# Altium footprint library Lib.PcbLib: 52 footprints (part 3 of 4)
Each footprint in its own frame and in the unit in brackets; x right, y up, seen from the top. Pads: shape width x height; smd on the part's side, far side on the other; paste and mask are expansions set on the pad; w line width, h text height; cw(c..) or ccw(c..) is an arc to the next point about the centre after c.
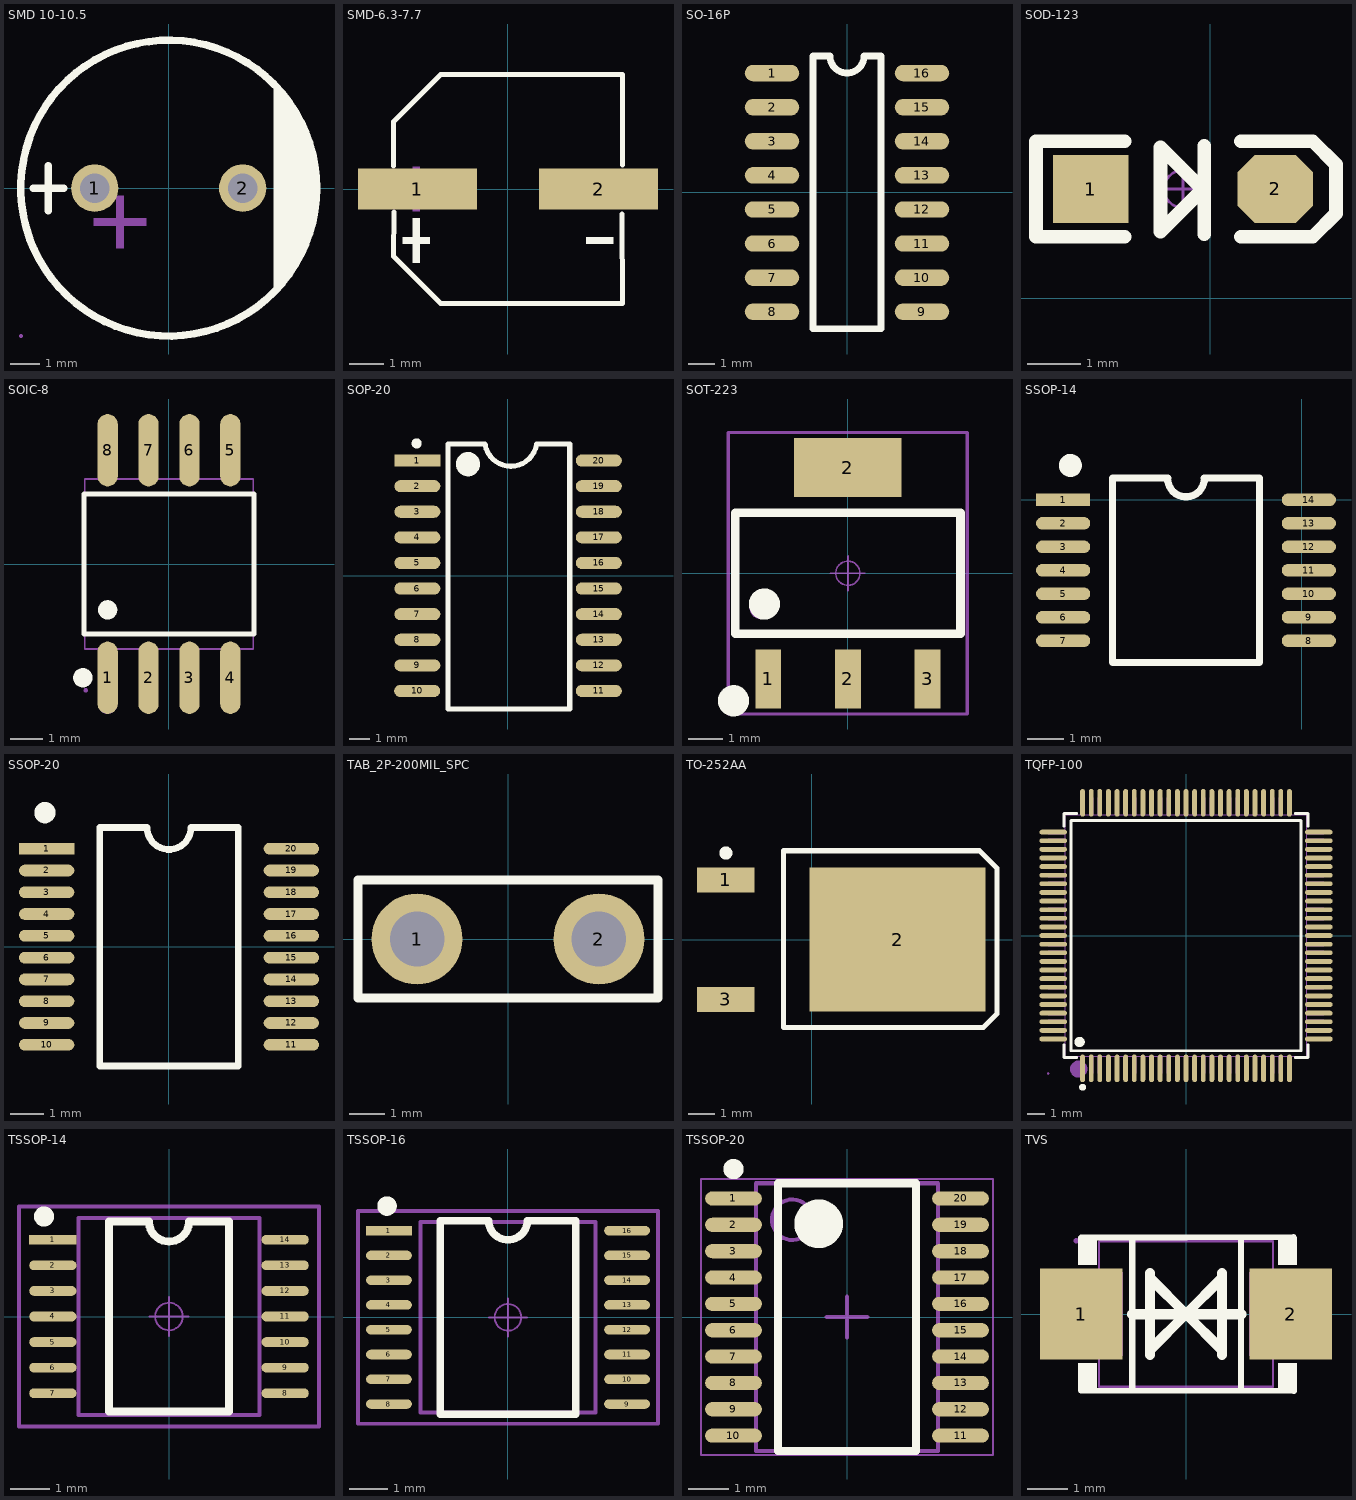
[diagram p2: the footprints below, top view; thin cyan lines are the x and y axes]

## SMD 10-10.5 [mm]
pads (2):
  round 1.6 hole 1 paste-2539.97 mask+0.05: 1(-2.5,0) 2(2.5,0)
Top Overlay:
  circle w0.254: c0,0 r5
  region: 3.555,3.556 3.555,-3.556 4.317,-2.54 4.825,-1.016 5.079,0.508 4.825,1.524
  lines w0.254: -4.573,0 -3.557,0 ; -4.065,-0.762 -4.065,0.762
Mechanical 6:
  region: -1.779,-0.762 -1.779,-2.032 -1.525,-2.032 -1.525,-0.254 -1.779,-0.254
  region: -2.541,-1.016 -0.763,-1.016 -0.763,-1.27 -2.541,-1.27
Mechanical 15:
  region: -4.94,-5 -4.94,-4.975 -4.976,-4.94 -5.025,-4.94 -5.06,-4.975 -5.06,-5 -5.06,-5.025 -5.025,-5.06 -4.976,-5.06 -4.94,-5.025
  region: 2.8,0 2.8,0.06 2.754,0.17 2.67,0.254 2.559,0.3 2.44,0.3 2.33,0.254 2.245,0.17 2.2,0.06 2.2,0 2.2,-0.06 2.245,-0.17 2.33,-0.254 2.44,-0.3 2.559,-0.3 2.67,-0.254 2.754,-0.17 2.8,-0.06
  region: -2.2,0 -2.2,0.06 -2.246,0.17 -2.33,0.254 -2.441,0.3 -2.56,0.3 -2.67,0.254 -2.755,0.17 -2.8,0.06 -2.8,0 -2.8,-0.06 -2.755,-0.17 -2.67,-0.254 -2.56,-0.3 -2.441,-0.3 -2.33,-0.254 -2.246,-0.17 -2.2,-0.06
  lines w0.051: -5,0 cw(c-0.001,0) 4.999,0 cw(c-0.001,0) -5,0
3D body "CAP 5X10X16.STEP": height 16.04, standoff -3.37, extent -5,-5 5.01,5

## SMD-6.3-7.7 [mm]
pads (2):
  rect 3.5x1.2 smd paste+0 mask+0.051: 1(-2.67,0) 2(2.67,0)
Top Overlay:
  region: -2.805,-0.858 -2.805,-2.178 -2.607,-2.178 -2.607,-0.858
  region: -3.102,-1.419 -3.102,-1.617 -2.31,-1.617 -2.31,-1.419
  region: 3.102,-1.419 3.102,-1.617 2.31,-1.617 2.31,-1.419
  lines w0.152: -3.376,0.686 -3.376,1.98 -1.98,3.376 3.376,3.376 3.369,0.708 ; -3.362,-0.686 -3.376,-1.981 -1.981,-3.376 3.376,-3.376 3.356,-0.739
Mechanical 15:
  region: -2.805,0.66 -2.805,-0.66 -2.607,-0.66 -2.607,0.66
  region: -3.102,0.099 -3.102,-0.099 -2.31,-0.099 -2.31,0.099
  region: 3.102,0.099 3.102,-0.099 2.31,-0.099 2.31,0.099
3D body "CT 6X6-V.STEP": height 6, standoff -0.01, extent -3.5,-3.15 3.5,3.15

## SO-16P [mil]
pads (16):
  oval 80x24 smd: 1(-110,175) 2(-110,125) 3(-110,75) 4(-110,25) 5(-110,-25) 6(-110,-75) 7(-110,-125) 8(-110,-175) 9(110,-175) 10(110,-125) 11(110,-75) 12(110,-25) 13(110,25) 14(110,75) 15(110,125) 16(110,175)
Top Overlay:
  lines w10: -50,-200 50,-200 50,200 25,200 cw(c0,200) -25,200 -50,200 -50,-200
3D body "SO-16.STEP": height 57, standoff 0, extent -115,-196.5 117.49,196.5

## SOD-123 [mil]
pads (2):
  rect 55x50 smd: 1(-87.5,80)
  oct 55x50 smd: 2(47.5,80)
Top Overlay:
  lines w10: -62.5,45 -127.5,45 -127.5,115 -62.5,115 ; -6,79.2 -36.4,48.8 -36.4,110.5 -4.4,78.5 ; -4.4,46.9 -4.4,111.7 ; 22.5,45 75,45 92,62 92,98 75,115 22.5,115
Mechanical 15:
  circle w1.97: c-20,80 r13.78
  lines w1.97: -39.68,80 -0.31,80 ; -20,60.32 -20,99.68
3D body "SOD-123.STEP": height 48.03, standoff 0, extent -92.84,48.5 52.83,111.5

## SOIC-8 [mm]
pads (8):
  oval 0.63x2.25 smd: 1(-1.905,-3.53) 2(-0.635,-3.53) 3(0.635,-3.53) 4(1.905,-3.53) 5(1.905,3.53) 6(0.635,3.53) 7(-0.635,3.53) 8(-1.905,3.53)
Top Overlay:
  circle w0.3: c-1.905,-1.424 r0.15
  circle w0.3: c-2.672,-3.53 r0.15
  lines w0.152: -2.639,-2.176 -2.639,2.176 2.639,2.176 2.639,-2.176 -2.639,-2.176
Mechanical 6:
  circle w0.3: c-1.905,-4.35 r0.15
Mechanical 15:
  region: -2.13,-3.95 -2.13,-3.3 -1.68,-3.3 -1.68,-3.95
  region: -2.13,-3.31 -2.13,-2.595 -1.68,-2.595 -1.68,-3.31
  region: -0.86,-3.95 -0.86,-3.3 -0.41,-3.3 -0.41,-3.95
  region: -0.86,-3.31 -0.86,-2.595 -0.41,-2.595 -0.41,-3.31
  region: 0.41,-3.95 0.41,-3.3 0.86,-3.3 0.86,-3.95
  region: 0.41,-3.31 0.41,-2.595 0.86,-2.595 0.86,-3.31
  region: 1.68,-3.95 1.68,-3.3 2.13,-3.3 2.13,-3.95
  region: 1.68,-3.31 1.68,-2.595 2.13,-2.595 2.13,-3.31
  region: -2.13,3.95 -2.13,3.3 -1.68,3.3 -1.68,3.95
  region: -2.13,3.31 -2.13,2.595 -1.68,2.595 -1.68,3.31
  region: -0.86,3.95 -0.86,3.3 -0.41,3.3 -0.41,3.95
  region: -0.86,3.31 -0.86,2.595 -0.41,2.595 -0.41,3.31
  region: 0.41,3.95 0.41,3.3 0.86,3.3 0.86,3.95
  region: 0.41,3.31 0.41,2.595 0.86,2.595 0.86,3.31
  region: 1.68,3.95 1.68,3.3 2.13,3.3 2.13,3.95
  region: 1.68,3.31 1.68,2.595 2.13,2.595 2.13,3.31
  region: -2.525,-3.92 -2.525,-3.895 -2.56,-3.86 -2.61,-3.86 -2.645,-3.895 -2.645,-3.92 -2.645,-3.945 -2.61,-3.98 -2.56,-3.98 -2.525,-3.945
  lines w0.051: -2.615,-2.64 -2.615,2.64 2.615,2.64 2.615,-2.64 -2.615,-2.64

## SOP-20 [mm]
pads (20):
  rect 2.286x0.6 smd: 1(-4.495,5.715)
  oval 2.286x0.6 smd: 2(-4.495,4.445) 3(-4.495,3.175) 4(-4.495,1.905) 5(-4.495,0.635) 6(-4.495,-0.635) 7(-4.495,-1.905) 8(-4.495,-3.175) 9(-4.495,-4.445) 10(-4.505,-5.715) 11(4.505,-5.715) 12(4.505,-4.445) 13(4.505,-3.175) 14(4.505,-1.905) 15(4.505,-0.635) 16(4.505,0.635) 17(4.505,1.905) 18(4.505,3.175) 19(4.505,4.445) 20(4.505,5.715)
Top Overlay:
  circle w0.6: c-1.986,5.535 r0.3
  circle w0.25: c-4.536,6.565 r0.125
  lines w0.254: -1.155,6.535 -2.986,6.535 -2.986,-6.604 3.064,-6.604 3.064,6.535 1.411,6.535 ; -1.131,6.479 ccw(c0.14,6.729) 1.411,6.477
3D body "SO-20_(Wide).STEP": height 2.7, standoff 0, extent -5.111,-6.4 5.189,6.4

## SOT-223 [mm]
pads (4):
  rect 0.75x1.7 smd: 1(-2.3,-3.048) 2(0,-3.048) 3(2.3,-3.048)
  rect 3.1x1.7 smd: 2(0,3.048)
Top Overlay:
  circle w0.5: c-3.302,-3.683 r0.2
  circle w0.5: c-2.413,-0.889 r0.2
  lines w0.25: -3.25,-1.75 3.25,-1.75 3.25,1.75 -3.25,1.75 -3.25,-1.75
Mechanical 13:
  circle w0.1: c-2.536,-1.016 r0.25
  lines w0.1: -3.25,-1.75 3.25,-1.75 3.25,1.75 -3.25,1.75 -3.25,-1.75
Mechanical 15:
  circle w0.05: c0,0 r0.35
  lines w0.05: -0.5,0 0.5,0 ; 0,-0.5 0,0.5
  lines w0.1: -3.45,-4.064 3.45,-4.064 3.45,4.064 -3.45,4.064 -3.45,-4.064
3D body "SOT223.STEP": height 1.65, standoff -0.02, extent -3.25,-3.508 3.25,3.508

## SSOP-14 [mm]
pads (14):
  rect 1.5x0.35 smd: 1(-6.6,0)
  oval 1.5x0.35 smd: 2(-6.6,-0.65) 3(-6.6,-1.3) 4(-6.6,-1.95) 5(-6.6,-2.6) 6(-6.6,-3.25) 7(-6.6,-3.9) 8(0.2,-3.9) 9(0.2,-3.25) 10(0.2,-2.6) 11(0.2,-1.95) 12(0.2,-1.3) 13(0.2,-0.65) 14(0.2,0)
Top Overlay:
  circle w0.381: c-6.4,0.95 r0.127
  lines w0.2: -5.232,-4.5 -5.232,0.6 -3.708,0.6 ccw(c-3.2,0.59) -2.692,0.6 -1.168,0.6 -1.168,-4.5 -5.232,-4.5
3D body "SSOP14.STEP": height 1.25, standoff -0.03, extent -6.402,-4.45 0.002,0.55

## SSOP-20 [mm]
pads (20):
  rect 1.65x0.35 smd: 1(-3.65,2.925)
  oval 1.65x0.35 smd: 2(-3.65,2.275) 3(-3.65,1.625) 4(-3.65,0.975) 5(-3.65,0.325) 6(-3.65,-0.325) 7(-3.65,-0.975) 8(-3.65,-1.625) 9(-3.65,-2.275) 10(-3.65,-2.925) 11(3.65,-2.925) 12(3.65,-2.275) 13(3.65,-1.625) 14(3.65,-0.975) 15(3.65,-0.325) 16(3.65,0.325) 17(3.65,0.975) 18(3.65,1.625) 19(3.65,2.275) 20(3.65,2.925)
Top Overlay:
  circle w0.381: c-3.7,4 r0.127
  lines w0.2: -2.065,-3.556 2.065,-3.556 2.065,3.556 0.655,3.556 cw(c0,3.556) -0.655,3.556 -2.065,3.556 -2.065,-3.556
3D body "SSOP20.STEP": height 1.65, standoff -0.03, extent -3.852,-3.6 3.852,3.6

## TAB_2P-200MIL_SPC [mil]
pads (2):
  round 100 hole 60: 1(-100,0) 2(100,0)
Top Overlay:
  lines w10: -165,-65 -165,65 165,65 165,-65 -165,-65

## TO-252AA [mm]
pads (3):
  rect 2.2x0.95 smd: 1(-3.275,2.28) 3(-3.275,-2.28)
  rect 6.7x5.5 smd: 2(3.275,0)
Top Overlay:
  circle w0.25: c-3.275,3.305 r0.125
  lines w0.1: -1.075,-3.35 -1.075,3.35
  lines w0.2: -1.075,-3.35 -1.075,3.391 6.403,3.391 7.069,2.725 7.069,-2.824 6.543,-3.35 -1.075,-3.35
3D body "D-PAK.STEP": height 2.31, standoff 0, extent -3.35,-3.3 5.9,3.3

## TQFP-100 [mm]
pads (100):
  oval 0.28x1.6 smd: 1(-6,-7.7) 2(-5.5,-7.7) 3(-5,-7.7) 4(-4.5,-7.7) 5(-4,-7.7) 6(-3.5,-7.7) 7(-3,-7.7) 8(-2.5,-7.7) 9(-2,-7.7) 10(-1.5,-7.7) 11(-1,-7.7) 12(-0.5,-7.7) 13(0,-7.7) 14(0.5,-7.7) 15(1,-7.7) 16(1.5,-7.7) 17(2,-7.7) 18(2.5,-7.7) 19(3,-7.7) 20(3.5,-7.7) 21(4,-7.7) 22(4.5,-7.7) 23(5,-7.7) 24(5.5,-7.7) 25(6,-7.7) 51(6,7.7) 52(5.5,7.7) 53(5,7.7) 54(4.5,7.7) 55(4,7.7) 56(3.5,7.7) 57(3,7.7) 58(2.5,7.7) 59(2,7.7) 60(1.5,7.7) 61(1,7.7) 62(0.5,7.7) 63(0,7.7) 64(-0.5,7.7) 65(-1,7.7) 66(-1.5,7.7) 67(-2,7.7) 68(-2.5,7.7) 69(-3,7.7) 70(-3.5,7.7) 71(-4,7.7) 72(-4.5,7.7) 73(-5,7.7) 74(-5.5,7.7) 75(-6,7.7)
  oval 1.6x0.28 smd: 26(7.7,-6) 27(7.7,-5.5) 28(7.7,-5) 29(7.7,-4.5) 30(7.7,-4) 31(7.7,-3.5) 32(7.7,-3) 33(7.7,-2.5) 34(7.7,-2) 35(7.7,-1.5) 36(7.7,-1) 37(7.7,-0.5) 38(7.7,0) 39(7.7,0.5) 40(7.7,1) 41(7.7,1.5) 42(7.7,2) 43(7.7,2.5) 44(7.7,3) 45(7.7,3.5) 46(7.7,4) 47(7.7,4.5) 48(7.7,5) 49(7.7,5.5) 50(7.7,6) 76(-7.7,6) 77(-7.7,5.5) 78(-7.7,5) 79(-7.7,4.5) 80(-7.7,4) 81(-7.7,3.5) 82(-7.7,3) 83(-7.7,2.5) 84(-7.7,2) 85(-7.7,1.5) 86(-7.7,1) 87(-7.7,0.5) 88(-7.7,0) 89(-7.7,-0.5) 90(-7.7,-1) 91(-7.7,-1.5) 92(-7.7,-2) 93(-7.7,-2.5) 94(-7.7,-3) 95(-7.7,-3.5) 96(-7.7,-4) 97(-7.7,-4.5) 98(-7.7,-5) 99(-7.7,-5.5) 100(-7.7,-6)
Top Overlay:
  circle w0.2: c-6,-8.8 r0.1
  circle w0.3: c-6.171,-6.171 r0.15
  lines w0.152: -7.076,-6.33 -7.076,-7.076 -6.33,-7.076 ; -7.076,6.33 -7.076,7.076 -6.33,7.076 ; 6.33,-7.076 7.076,-7.076 7.076,-6.33 ; 6.33,7.076 7.076,7.076 7.076,6.33 ; -6.671,-6.671 -6.671,6.671 6.671,6.671 6.671,-6.671 -6.671,-6.671
Mechanical 6:
  circle w0.5: c-6.223,-7.747 r0.25
Mechanical 15:
  drawing of 205 lines, arcs and shapes, not listed
3D body "TQFP100_14x14.STEP": height 1.05, standoff 0, extent -8.002,-8.002 8.002,8.002

## TSSOP-14 [mm]
pads (14):
  rect 1.2x0.25 smd: 1(-2.95,1.95)
  oval 1.2x0.25 smd: 2(-2.95,1.3) 3(-2.95,0.65) 4(-2.95,0) 5(-2.95,-0.65) 6(-2.95,-1.3) 7(-2.95,-1.95) 8(2.95,-1.95) 9(2.95,-1.3) 10(2.95,-0.65) 11(2.95,0) 12(2.95,0.65) 13(2.95,1.3) 14(2.95,1.95)
Top Overlay:
  circle w0.254: c-3.175,2.54 r0.13
  lines w0.2: -0.508,2.413 -1.524,2.413 -1.524,-2.413 1.524,-2.413 1.524,2.413 0.508,2.413 ; -0.506,2.373 ccw(c0,2.413) 0.506,2.373
Mechanical 13:
  lines w0.1: -2.3,-2.5 2.3,-2.5 2.3,2.5 -2.3,2.5 -2.3,-2.5
Mechanical 15:
  circle w0.05: c0,0 r0.35
  lines w0.05: -0.5,0 0.5,0 ; 0,-0.5 0,0.5
  lines w0.1: -3.81,-2.794 3.81,-2.794 3.81,2.794 -3.81,2.794 -3.81,-2.794
3D body "TSSOP14.STEP": height 1.03, standoff -0.02, extent -3.202,-2.5 3.202,2.5

## TSSOP-16 [mm]
pads (16):
  rect 1.2x0.25 smd: 1(-3.125,2.275)
  oval 1.2x0.25 smd: 2(-3.125,1.625) 3(-3.125,0.975) 4(-3.125,0.325) 5(-3.125,-0.325) 6(-3.125,-0.975) 7(-3.125,-1.625) 8(-3.125,-2.275) 9(3.125,-2.275) 10(3.125,-1.625) 11(3.125,-0.975) 12(3.125,-0.325) 13(3.125,0.325) 14(3.125,0.975) 15(3.125,1.625) 16(3.125,2.275)
Top Overlay:
  circle w0.254: c-3.175,2.921 r0.13
  lines w0.2: -1.778,-2.54 -1.778,2.54 -0.508,2.54 ccw(c0,2.54) 0.508,2.54 1.778,2.54 1.778,-2.54 -1.778,-2.54
Mechanical 13:
  lines w0.1: -2.3,-2.5 2.3,-2.5 2.3,2.5 -2.3,2.5 -2.3,-2.5
Mechanical 15:
  circle w0.05: c0,0 r0.35
  lines w0.05: -0.5,0 0.5,0 ; 0,-0.5 0,0.5
  lines w0.1: -3.937,-2.794 -3.937,2.794 3.937,2.794 3.937,-2.794 -3.937,-2.794
3D body "TSSOP16.STEP": height 1.03, standoff -0.02, extent -3.202,-2.5 3.202,2.5

## TSSOP-20 [mm]
pads (20):
  oval 1.4x0.35 smd: 1(-2.8,2.925) 2(-2.8,2.275) 3(-2.8,1.625) 4(-2.8,0.975) 5(-2.8,0.325) 6(-2.8,-0.325) 7(-2.8,-0.975) 8(-2.8,-1.625) 9(-2.8,-2.275) 10(-2.8,-2.925) 11(2.8,-2.925) 12(2.8,-2.275) 13(2.8,-1.625) 14(2.8,-0.975) 15(2.8,-0.325) 16(2.8,0.325) 17(2.8,0.975) 18(2.8,1.625) 19(2.8,2.275) 20(2.8,2.925)
Top Overlay:
  circle w0.25: c-2.8,3.65 r0.125
  circle w0.6: c-0.7,2.3 r0.3
  lines w0.2: -1.7,-3.3 -1.7,3.3 1.7,3.3 1.7,-3.3 -1.7,-3.3
Mechanical 13:
  circle w0.1: c-1.35,2.4 r0.5
  lines w0.1: -2.25,-3.3 -2.25,3.3 2.25,3.3 2.25,-3.3 -2.25,-3.3
Mechanical 15:
  lines w0.05: -3.6,-3.4 -3.6,3.4 3.6,3.4 3.6,-3.4 -3.6,-3.4
  lines w0.1: -0.5,0 0.5,0 ; 0,-0.5 0,0.5
3D body "TSSOP20.STEP": height 1.03, standoff -0.02, extent -3.177,-3.25 3.227,3.25

## TVS [mm]
pads (2):
  rect 2.047x2.241 smd: 1(-2.591,0) 2(2.591,0)
Top Overlay:
  region: -2.667,-1.905 -2.667,-1.215 -2.21,-1.215 -2.21,-1.905
  region: -2.667,1.905 -2.667,1.215 -2.21,1.215 -2.21,1.905
  region: 2.286,1.905 2.286,1.215 2.743,1.215 2.743,1.905
  region: 2.286,-1.905 2.286,-1.215 2.743,-1.215 2.743,-1.905
  lines w0.152: -2.599,-1.89 2.667,-1.905 ; -2.591,1.887 2.663,1.905 ; -1.331,-1.886 -1.331,1.886 ; 1.364,-1.886 1.364,1.886
  lines w0.254: -1.331,-0.008 1.364,-0.008 ; 0,0 0.889,0.889 0.889,1.016 0.889,-1.016 0.889,-0.889 0,0 ; 0,0 -0.889,-0.889 -0.889,-1.016 -0.889,1.016 -0.889,0.889 0,0
Mechanical 15:
  region: -2.708,1.037 -2.708,-1.037 -1.568,-1.037 -1.568,1.037
  region: 2.708,1.037 2.708,-1.037 1.568,-1.037 1.568,1.037
  region: -2.659,1.816 -2.659,1.841 -2.694,1.876 -2.744,1.876 -2.779,1.841 -2.779,1.816 -2.779,1.791 -2.744,1.756 -2.694,1.756 -2.659,1.791
  lines w0.051: -2.15,-1.8 -2.15,1.8 2.15,1.8 2.15,-1.8 -2.15,-1.8